# Altium footprint library Wurth_Elektronik_Electromechanic_Wire_to_Board_Connectors_rev16a.PCBLIB: 662 footprints (part 29 of 42)
Each footprint in its own frame and in the unit in brackets; x right, y up, seen from the top. Pads: shape width x height; smd on the part's side, far side on the other; paste and mask are expansions set on the pad; w line width, h text height; cw(c..) or ccw(c..) is an arc to the next point about the centre after c.
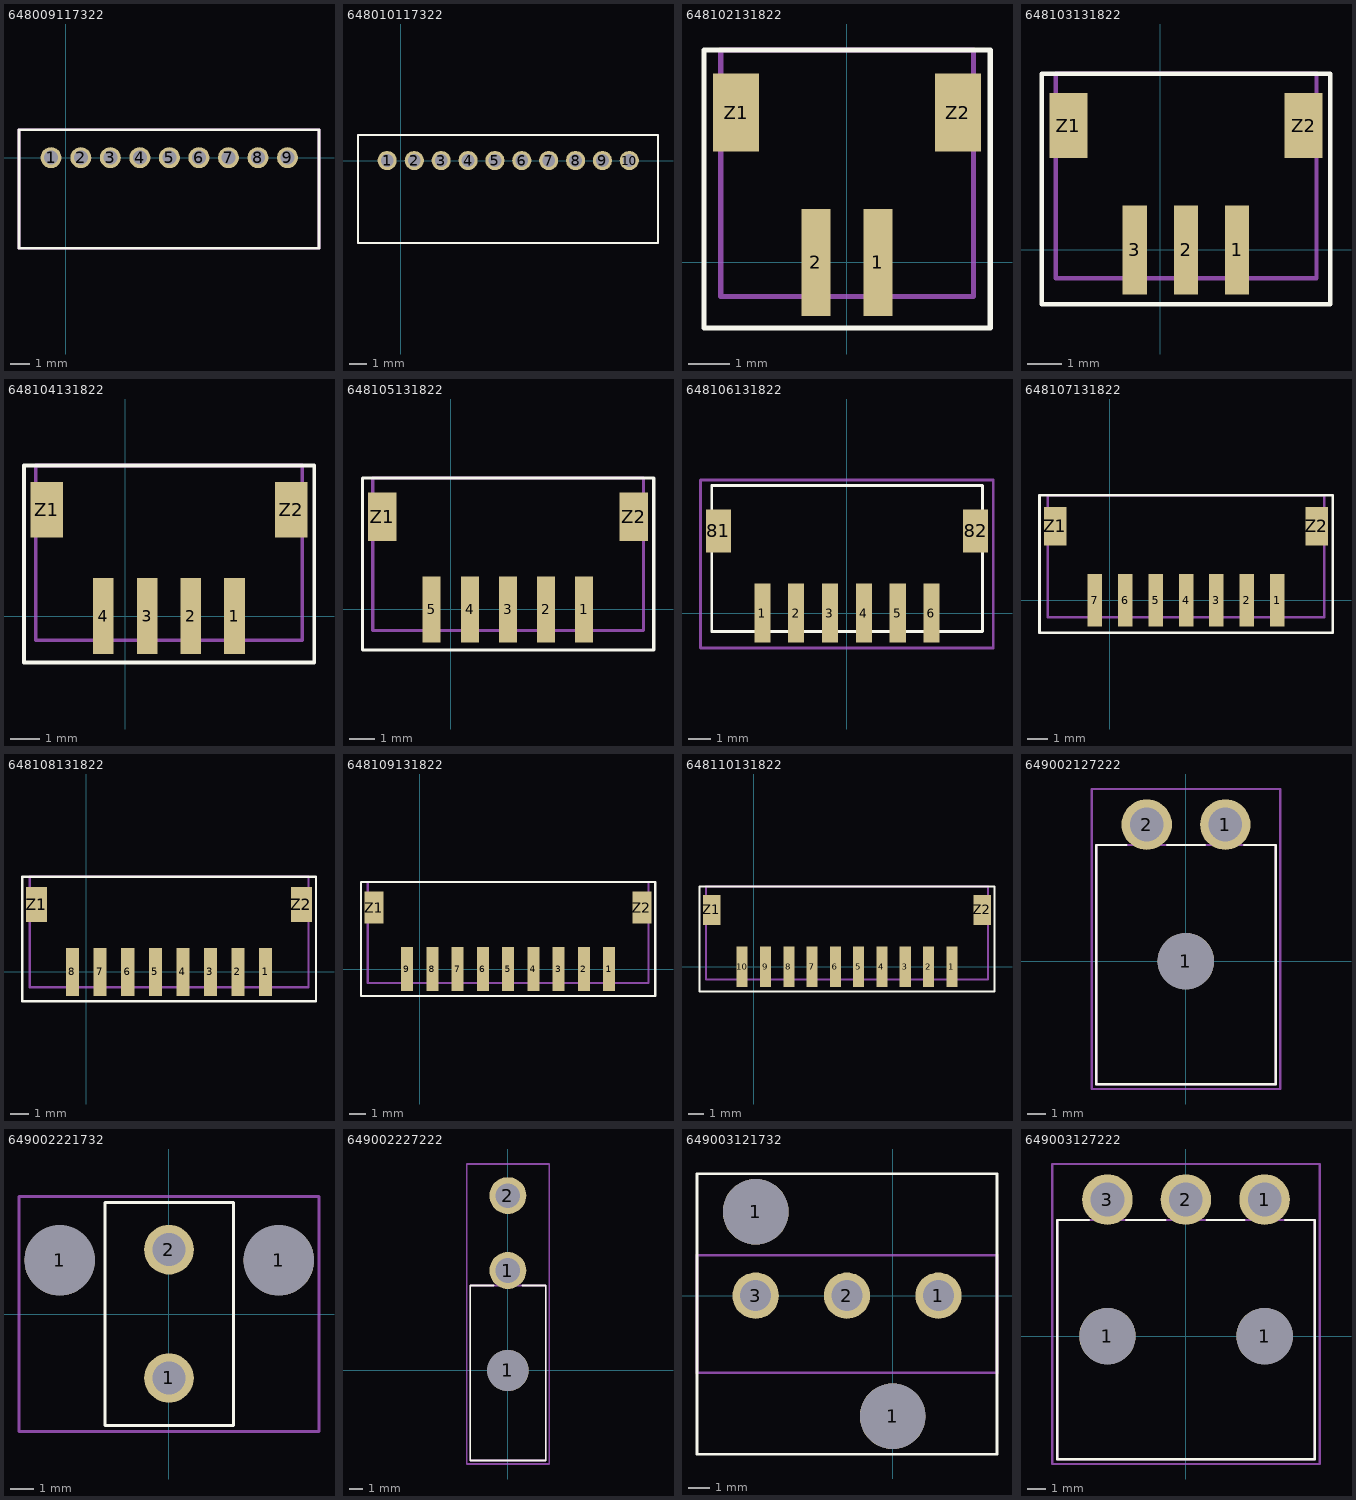
[diagram p28: the footprints below, top view; thin cyan lines are the x and y axes]

## 648009117322 [mil]
pads (9):
  round 42 hole 28: 1(-29.53,0) 2(30,0) 3(89,0) 4(148,0) 5(207,0) 6(266,0) 7(325,0) 8(384,0) 9(443,0)
Top Overlay:
  lines w5: -93.5,-181.1 -93.5,56 506,56 506,-181.1 -93.5,-181.1
Mechanical 2:
  text ">NAME" at 567,-29.53 h77.5
Mechanical 4:
  text ">VALUE" at 567,-88.58 h77.5
Mechanical 16:
  lines w5: -93.5,-181.1 506,-181.1 506,56 -93.5,56 -93.5,-181.1
  text "1" at -44.29,-29.53 h77.5
  text "9" at 429,-29.53 h77.5

## 648010117322 [mil]
pads (10):
  round 42 hole 28: 1(-29.53,0) 2(30,0) 3(89,0) 4(148,0) 5(207,0) 6(266,0) 7(325,0) 8(384,0) 9(443,0) 10(502,0)
Top Overlay:
  lines w5: -93.5,-181.1 -93.5,56 565,56 565,-181.1 -93.5,-181.1
Mechanical 2:
  text ">NAME" at 617,-29.53 h77.5
Mechanical 4:
  text ">VALUE" at 617,-88.58 h77.5
Mechanical 16:
  lines w5: -93.5,-181.1 565,-181.1 565,56 -93.5,56 -93.5,-181.1
  text "1" at -44.29,-29.53 h77.5
  text "10" at 458,-29.53 h77.5

## 648102131822 [mil]
pads (4):
  rect 28x103 smd: 1(30,0) 2(-29.53,0)
  rect 44x75 smd: Z1(-106.3,144) Z2(107,144)
Top Overlay:
  lines w5: -137.01,-62.99 138,-62.99 138,204 -137.01,204 -137.01,-62.99
Mechanical 2:
  text ">NAME" at -120.08,220 h77.5
Mechanical 4:
  text ">VALUE" at -149.51,-131 h77.5
Mechanical 16:
  lines w5: -121.06,-32.68 -121.06,204 122,204 122,-32.68 -121.06,-32.68
  text "1" at 25,0 h77.5

## 648103131822 [mil]
pads (5):
  rect 28x103 smd: 1(89,0) 2(30,0) 3(-29.53,0)
  rect 44x75 smd: Z1(-106.3,144) Z2(166,144)
Top Overlay:
  lines w5: -137.01,-62.99 197,-62.99 197,204 -137.01,204 -137.01,-62.99
Mechanical 2:
  text ">NAME" at -100,225 h77.5
Mechanical 4:
  text ">VALUE" at -99.51,-131 h77.5
Mechanical 16:
  lines w5: -121.06,-32.68 -121.06,204 181,204 181,-32.68 -121.06,-32.68
  text "1" at 75,0 h77.5

## 648104131822 [mil]
pads (6):
  rect 28x103 smd: 1(148,0) 2(89,0) 3(30,0) 4(-29.53,0)
  rect 44x75 smd: Z1(-106.3,144) Z2(225,144)
Top Overlay:
  lines w5: -137.01,-62.99 256,-62.99 256,204 -137.01,204 -137.01,-62.99
Mechanical 2:
  text ">NAME" at -75,225 h77.5
Mechanical 4:
  text ">VALUE" at -74.51,-131 h77.5
Mechanical 16:
  lines w5: -121.06,-32.68 -121.06,204 240,204 240,-32.68 -121.06,-32.68
  text "1" at 125,0 h77.5

## 648105131822 [mil]
pads (7):
  rect 28x103 smd: 1(207,0) 2(148,0) 3(89,0) 4(30,0) 5(-29.53,0)
  rect 44x75 smd: Z1(-106.3,144) Z2(284,144)
Top Overlay:
  lines w5: -137.01,-62.99 315,-62.99 315,204 -137.01,204 -137.01,-62.99
Mechanical 2:
  text ">NAME" at -25,225 h77.5
Mechanical 4:
  text ">VALUE" at -49.51,-131 h77.5
Mechanical 16:
  lines w5: -121.06,-32.68 -121.06,204 299,204 299,-32.68 -121.06,-32.68
  text "1" at 200,0 h77.5

## 648106131822 [mil]
pads (8):
  rect 28x103 smd: 1(-147.64,0) 2(-88.58,0) 3(-29.53,0) 4(30,0) 5(89,0) 6(148,0)
  rect 44x75 smd: 81(-224.41,144) 82(225,144)
Top Overlay:
  lines w5: -236.22,-32.28 -236.22,223 237,223 237,-32.28 -236.22,-32.28
Mechanical 2:
  text ">NAME" at -236.22,253 h77.5
Mechanical 4:
  text ">VALUE" at -236.22,-123.54 h77.5
Mechanical 27:
  lines w5: -255.91,-61.02 -255.91,233 256,233 256,-61.02 -255.91,-61.02

## 648107131822 [mil]
pads (9):
  rect 28x103 smd: 1(325,0) 2(266,0) 3(207,0) 4(148,0) 5(89,0) 6(30,0) 7(-29.53,0)
  rect 44x75 smd: Z1(-106.3,144) Z2(402,144)
Top Overlay:
  lines w5: -137.01,-62.99 433,-62.99 433,204 -137.01,204 -137.01,-62.99
Mechanical 2:
  text ">NAME" at 25,225 h77.5
Mechanical 4:
  text ">VALUE" at -24.51,-131 h77.5
Mechanical 16:
  lines w5: -121.06,-32.68 -121.06,204 417,204 417,-32.68 -121.06,-32.68
  text "1" at 300,0 h77.5

## 648108131822 [mil]
pads (10):
  rect 28x103 smd: 1(384,0) 2(325,0) 3(266,0) 4(207,0) 5(148,0) 6(89,0) 7(30,0) 8(-29.53,0)
  rect 44x75 smd: Z1(-106.3,144) Z2(461,144)
Top Overlay:
  lines w5: -137.01,-62.99 492,-62.99 492,204 -137.01,204 -137.01,-62.99
Mechanical 2:
  text ">NAME" at 75,225 h77.5
Mechanical 4:
  text ">VALUE" at 51,-131 h77.5
Mechanical 16:
  lines w5: -121.06,-32.68 -121.06,204 476,204 476,-32.68 -121.06,-32.68
  text "1" at 375,0 h77.5

## 648109131822 [mil]
pads (11):
  rect 28x103 smd: 1(443,0) 2(384,0) 3(325,0) 4(266,0) 5(207,0) 6(148,0) 7(89,0) 8(30,0) 9(-29.53,0)
  rect 44x75 smd: Z1(-106.3,144) Z2(520,144)
Top Overlay:
  lines w5: -137.01,-62.99 551,-62.99 551,204 -137.01,204 -137.01,-62.99
Mechanical 2:
  text ">NAME" at 100,225 h77.5
Mechanical 4:
  text ">VALUE" at 76,-131 h77.5
Mechanical 16:
  lines w5: -121.06,-32.68 -121.06,204 535,204 535,-32.68 -121.06,-32.68
  text "1" at 425,0 h77.5

## 648110131822 [mil]
pads (12):
  rect 28x103 smd: 1(502,0) 2(443,0) 3(384,0) 4(325,0) 5(266,0) 6(207,0) 7(148,0) 8(89,0) 9(30,0) 10(-29.53,0)
  rect 44x75 smd: Z1(-106.3,144) Z2(579,144)
Top Overlay:
  lines w5: -137.01,-62.99 610,-62.99 610,204 -137.01,204 -137.01,-62.99
Mechanical 2:
  text ">NAME" at 150,225 h77.5
Mechanical 4:
  text ">VALUE" at 126,-131 h77.5
Mechanical 16:
  lines w5: -121.06,-32.68 -121.06,204 594,204 594,-32.68 -121.06,-32.68
  text "1" at 475,0 h77.5

## 649002127222 [mil]
pads (3):
  round 119 hole 119: 1(0,0)
  round 106.5 hole 71: 1(83,288) 2(-82.68,288)
Top Overlay:
  lines w5: -125.98,245 -188.98,245 -188.98,-259.84 189,-259.84 189,245 123,245 ; -39.37,245 40,245
Mechanical 2:
  text ">NAME" at -117.13,390 h77.5
Mechanical 4:
  text ">VALUE" at -119.69,-358.66 h77.5
Mechanical 16:
  lines w5: -188.98,-259.84 -188.98,245 189,245 189,-259.84 -188.98,-259.84
  text "1" at 75,263 h77.5
  text "2" at -100,263 h77.5
Mechanical 27:
  lines w5: -198.82,-269.69 199,-269.69 199,363 -198.82,363 -198.82,-269.69

## 649002221732 [mil]
pads (4):
  round 119 hole 119: 1(-185.04,91) 1(186,91)
  round 84 hole 56: 1(0,-108.27) 2(0,109)
Top Overlay:
  lines w5: -108.27,-188.98 109,-188.98 109,189 -108.27,189 -108.27,-188.98
Mechanical 2:
  text ">NAME" at -104.33,237 h77.5
Mechanical 4:
  text ">VALUE" at -96.46,-277.56 h77.5
Mechanical 16:
  text "1" at -25,-125 h77.5
  text "2" at -25,75 h77.5
Mechanical 27:
  lines w5: -253.94,-198.82 254,-198.82 254,199 -253.94,199 -253.94,-198.82

## 649002227222 [mil]
pads (3):
  round 119 hole 119: 1(0,0)
  round 106.5 hole 71: 1(0,288) 2(0,504)
Top Overlay:
  lines w5: -41.34,245 -108.27,245 -108.27,-259.84 109,-259.84 109,245 42,245
Mechanical 2:
  text ">NAME" at -436.71,62 h77.5
Mechanical 4:
  text ">VALUE" at -436.71,-42.62 h77.5
Mechanical 16:
  lines w5: -108.27,-259.84 109,-259.84 109,245 -108.27,245 -108.27,-259.84
  text "1" at -25,246 h77.5
Mechanical 27:
  lines w5: -118.11,-269.69 119,-269.69 119,595 -118.11,595 -118.11,-269.69

## 649003121732 [mil]
pads (5):
  round 119 hole 119: 1(-248.03,152) 1(0,-218.5)
  round 84 hole 56: 1(83,0) 2(-82.68,0) 3(-248.03,0)
Top Overlay:
  lines w5: -354.33,-287.4 189,-287.4 189,221 -354.33,221 -354.33,-287.4
Mechanical 2:
  text ">NAME" at -200,250 h77.5
Mechanical 4:
  text ">VALUE" at -225,-350 h77.5
Mechanical 16:
  lines w5: -354.33,-139.76 189,-139.76 189,73 -354.33,73 -354.33,-139.76
  text "1" at 75,-25 h77.5
  text "3" at -259.65,-25 h77.5

## 649003127222 [mil]
pads (5):
  round 119 hole 119: 1(-165.35,0) 1(166,0)
  round 106.5 hole 71: 1(166,288) 2(0,288) 3(-165.35,288)
Top Overlay:
  lines w5: -204.72,245 -271.65,245 -271.65,-259.84 272,-259.84 272,245 209,245 ; -125.98,245 -43.31,245 ; 44,245 123,245
Mechanical 2:
  text ">NAME" at -130.51,387 h77.5
Mechanical 4:
  text ">VALUE" at -134.45,-332.28 h77.5
Mechanical 16:
  lines w5: -271.65,-259.84 -271.65,245 272,245 272,-259.84 -271.65,-259.84
  text "1" at 158,263 h77.5
  text "3" at -192.32,263 h77.5
Mechanical 27:
  lines w5: -281.5,-269.69 282,-269.69 282,363 -281.5,363 -281.5,-269.69